# Altium footprint library My Footprint 3D.PCBLIB: 447 footprints (part 15 of 29)
Each footprint in its own frame and in the unit in brackets; x right, y up, seen from the top. Pads: shape width x height; smd on the part's side, far side on the other; paste and mask are expansions set on the pad; w line width, h text height; cw(c..) or ccw(c..) is an arc to the next point about the centre after c.
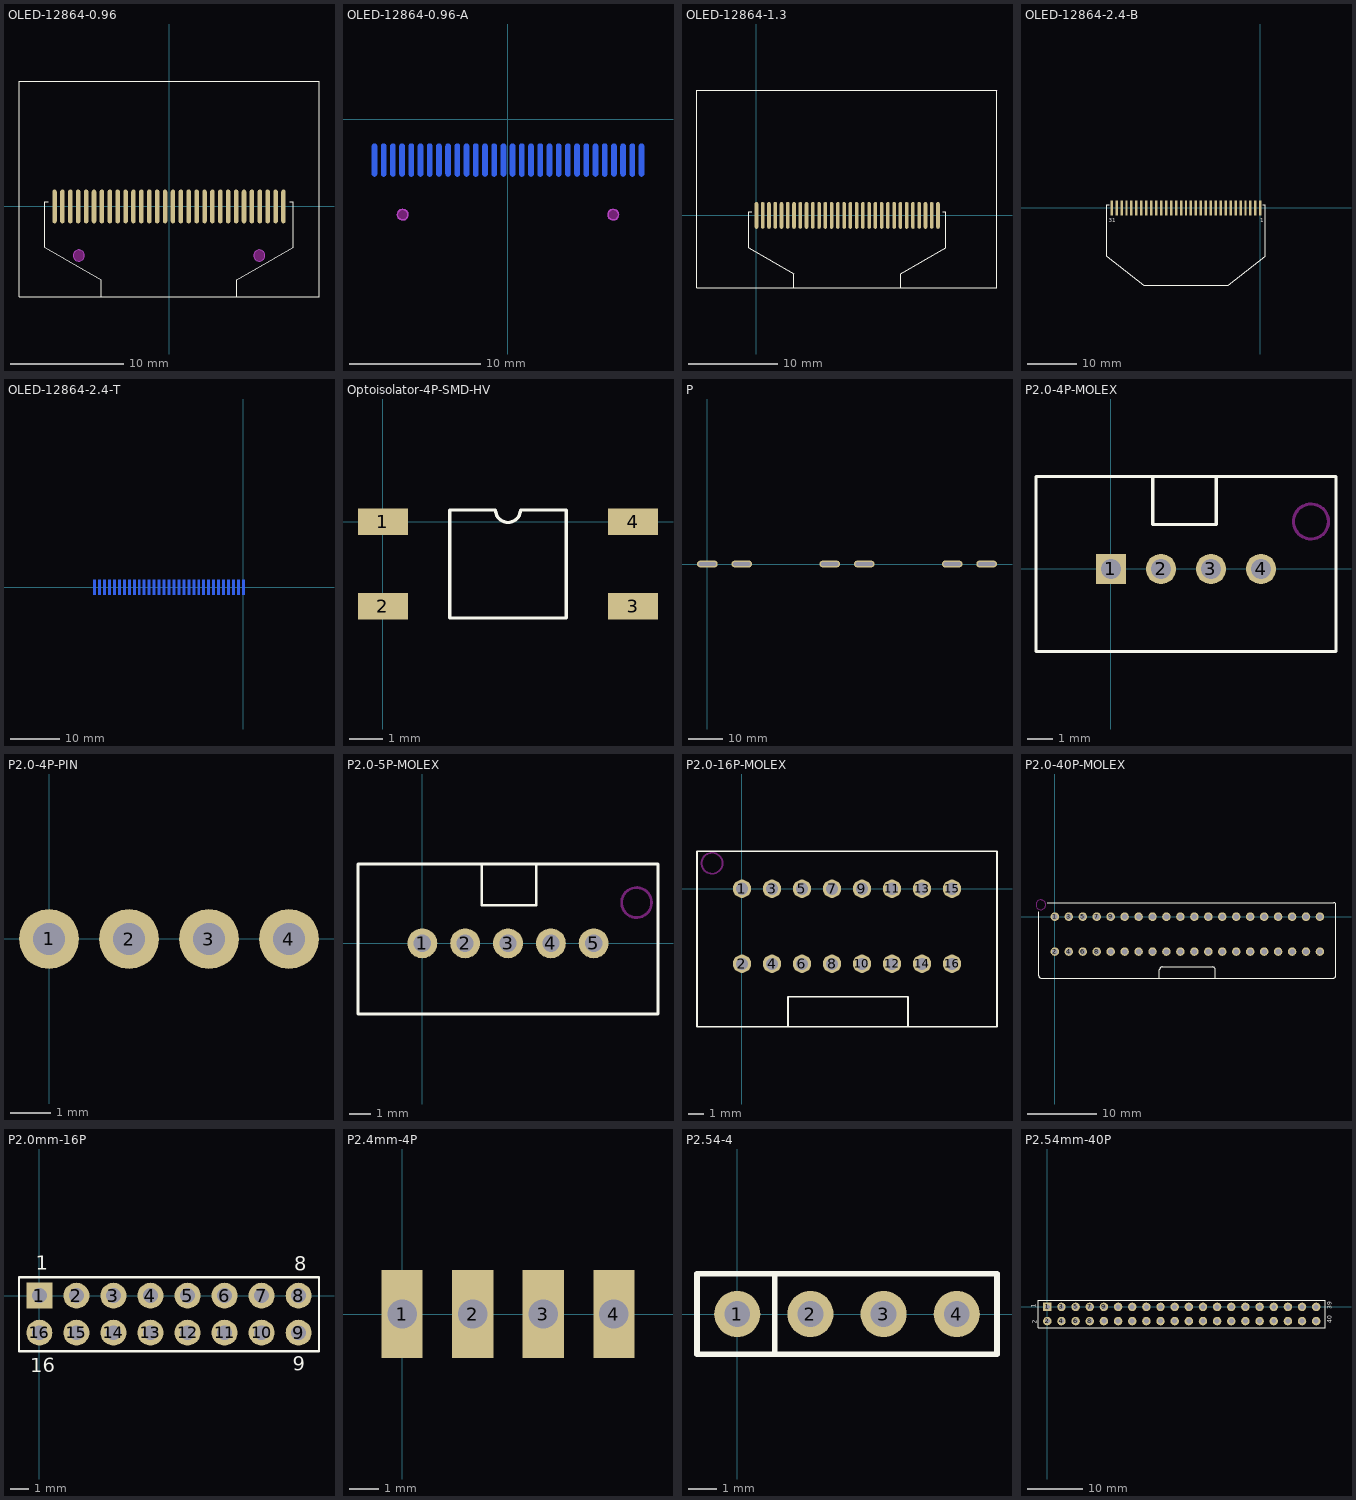
[diagram p14: the footprints below, top view; thin cyan lines are the x and y axes]

## OLED-12864-0.96 [mm]
pads (30):
  oval 0.4x3 smd: 1(-10.15,0) 2(-9.45,0) 3(-8.75,0) 4(-8.05,0) 5(-7.35,0) 6(-6.65,0) 7(-5.95,0) 8(-5.25,0) 9(-4.55,0) 10(-3.85,0) 11(-3.15,0) 12(-2.45,0) 13(-1.75,0) 14(-1.05,0) 15(-0.35,0) 16(0.35,0) 17(1.05,0) 18(1.75,0) 19(2.45,0) 20(3.15,0) 21(3.85,0) 22(4.55,0) 23(5.25,0) 24(5.95,0) 25(6.65,0) 26(7.35,0) 27(8.05,0) 28(8.75,0) 29(9.45,0) 30(10.15,0)
Top Overlay:
  lines w0.1: -10.7,0.4 -11,0.4 -11,-3.6 -6,-6.5 ; -6,-8 -6,-6.5 ; 10.7,0.4 11,0.4 11,-3.6 6,-6.5 6,-8 ; -6,-6.5 ccw(c-6,-6.5) -6,-6.5 ; 6,-8 ccw(c6,-8) 6,-8 ; -13.3,-8 13.3,-8 13.3,11.1 -13.3,11.1 -13.3,-8
Keep-Out Layer:
  board cut-out: -8,-3.85 -7.901,-3.85 -7.717,-3.926 -7.576,-4.067 -7.5,-4.251 -7.5,-4.35 -7.5,-4.449 -7.576,-4.633 -7.717,-4.774 -7.901,-4.85 -8,-4.85 -8.099,-4.85 -8.283,-4.774 -8.424,-4.633 -8.5,-4.449 -8.5,-4.35 -8.5,-4.251 -8.424,-4.067 -8.283,-3.926 -8.099,-3.85
  board cut-out: 8,-3.85 8.099,-3.85 8.283,-3.926 8.424,-4.067 8.5,-4.251 8.5,-4.35 8.5,-4.449 8.424,-4.633 8.283,-4.774 8.099,-4.85 8,-4.85 7.901,-4.85 7.717,-4.774 7.576,-4.633 7.5,-4.449 7.5,-4.35 7.5,-4.251 7.576,-4.067 7.717,-3.926 7.901,-3.85
Mechanical 2:
  circle w0.1: c-8,-4.35 r0.5
  circle w0.1: c8,-4.35 r0.5
3D body: height 0.1, standoff 0, extent -11,-8 11,0.4
3D body: height 3.5, standoff 3.4, extent -6,-8.9 6,-7.2
3D body: height 3.5, standoff 3, extent -6,-8.9 6,-8.8
3D body: height 3.49, standoff 3, extent -5,-7.1 5,-5.6
3D body: height 4.3, standoff 4.2, extent -13.3,-3.5 13.3,10.9
3D body: height 4.31, standoff 4.3, extent -10.875,-1.75 10.875,9.15
3D body: height 4.29, standoff 3.51, extent -13.4,-8.05 13.4,11.15
3D body: height 3.5, standoff 2.9, extent -13.4,-3.75 13.4,11.15

## OLED-12864-0.96-A [mm]
pads (30):
  oval 0.4x2.5 smd far side: 1(-10.15,-3.1) 2(-9.45,-3.1) 3(-8.75,-3.1) 4(-8.05,-3.1) 5(-7.35,-3.1) 6(-6.65,-3.1) 7(-5.95,-3.1) 8(-5.25,-3.1) 9(-4.55,-3.1) 10(-3.85,-3.1) 11(-3.15,-3.1) 12(-2.45,-3.1) 13(-1.75,-3.1) 14(-1.05,-3.1) 15(-0.35,-3.1) 16(0.35,-3.1) 17(1.05,-3.1) 18(1.75,-3.1) 19(2.45,-3.1) 20(3.15,-3.1) 21(3.85,-3.1) 22(4.55,-3.1) 23(5.25,-3.1) 24(5.95,-3.1) 25(6.65,-3.1) 26(7.35,-3.1) 27(8.05,-3.1) 28(8.75,-3.1) 29(9.45,-3.1) 30(10.15,-3.1)
Bottom Overlay:
  lines w0.1: -10.7,-2.5 -11,-2.5 -11,-6.5 -7.158,-8.728 ; 7.127,-8.746 11,-6.5 11,-2.5 10.7,-2.5
Keep-Out Layer:
  circle w0.1: c8,-7.25 r0.4
  circle w0.1: c-8,-7.25 r0.4
  board cut-out: 8,-6.85 8.08,-6.85 8.227,-6.911 8.339,-7.023 8.4,-7.17 8.4,-7.25 8.4,-7.33 8.339,-7.477 8.227,-7.589 8.08,-7.65 8,-7.65 7.92,-7.65 7.773,-7.589 7.661,-7.477 7.6,-7.33 7.6,-7.25 7.6,-7.17 7.661,-7.023 7.773,-6.911 7.92,-6.85
  board cut-out: -8,-6.85 -7.92,-6.85 -7.773,-6.911 -7.661,-7.023 -7.6,-7.17 -7.6,-7.25 -7.6,-7.33 -7.661,-7.477 -7.773,-7.589 -7.92,-7.65 -8,-7.65 -8.08,-7.65 -8.227,-7.589 -8.339,-7.477 -8.4,-7.33 -8.4,-7.25 -8.4,-7.17 -8.339,-7.023 -8.227,-6.911 -8.08,-6.85
Mechanical 2:
  circle w0.1: c8,-7.25 r0.4
  circle w0.1: c-8,-7.25 r0.4
3D body: height 2.5, standoff 1.9, extent -13.4,-3.75 13.4,11.15
3D body: height 3.29, standoff 2.51, extent -13.4,-8.05 13.4,11.15
3D body: height 3.31, standoff 3.3, extent -10.875,-1.75 10.875,9.15
3D body: height 3.3, standoff 3.2, extent -13.3,-3.5 13.3,10.9
3D body: height 2.49, standoff 2, extent -5,-7.1 5,-5.6
3D body: height 2.5, standoff -1.2, extent -6,-8.9 6,-8.8
3D body: height 2.5, standoff 2.4, extent -6,-8.9 6,-7.2
3D body: height -1, standoff -1.2, extent -11,-8.927 11,-2.5

## OLED-12864-1.3 [mm]
pads (30):
  oval 0.4x3 smd: 1(0,0) 2(0.7,0) 3(1.4,0) 4(2.1,0) 5(2.8,0) 6(3.5,0) 7(4.2,0) 8(4.9,0) 9(5.6,0) 10(6.3,0) 11(7,0) 12(7.7,0) 13(8.4,0) 14(9.1,0) 15(9.8,0) 16(10.5,0) 17(11.2,0) 18(11.9,0) 19(12.6,0) 20(13.3,0) 21(14,0) 22(14.7,0) 23(15.4,0) 24(16.1,0) 25(16.8,0) 26(17.5,0) 27(18.2,0) 28(18.9,0) 29(19.6,0) 30(20.3,0)
Top Overlay:
  lines w0.1: -0.55,0.4 -0.85,0.4 -0.85,-3.6 4.15,-6.5 4.15,-8.1 ; 16.15,-8.1 16.15,-6.5 21.15,-3.6 21.15,0.4 20.85,0.4 ; -6.65,-8.1 26.85,-8.1 26.85,14 -6.65,14 -6.65,-8.1
Mechanical 1:
  lines w0.1: -6.6,14 26.9,14
3D body: height 0.85, standoff 0.15, extent -7.1,-4.7 27.4,14.5
3D body: height 1.6, standoff 0.85, extent -7.1,-8.5 27.4,14.5
3D body: height 1.75, standoff 1.6, extent -6.6,-4.2 26.9,14
3D body: height 0.8, standoff 0.7, extent -4.55,-2.45 24.85,12.25
3D body: height 0.1, standoff 0, extent -0.85,-9.6 21.15,0.4
3D body: height 0.85, standoff 0.75, extent 4.15,-9.6 16.15,-6.5
3D body: height 0.85, standoff 0, extent 4.15,-9.6 16.15,-9.5
3D body: height 0.85, standoff 0.5, extent 5.15,-7.1 15.15,-5.6

## OLED-12864-2.4-B [mm]
pads (31):
  rect 0.5x3 smd: 1(0,0) 2(-1,0) 3(-2,0) 4(-3,0) 5(-4,0) 6(-5,0) 7(-6,0) 8(-7,0) 9(-8,0) 10(-9,0) 11(-10,0) 12(-11,0) 13(-12,0) 14(-13,0) 15(-14,0) 16(-15,0) 17(-16,0) 18(-17,0) 19(-18,0) 20(-19,0) 21(-20,0) 22(-21,0) 23(-22,0) 24(-23,0) 25(-24,0) 26(-25,0) 27(-26,0) 28(-27,0) 29(-28,0) 30(-29,0) 31(-30,0)
Top Overlay:
  lines w0.1: -30.494,0.635 -31,0.635 -31,-9.8 -23.559,-15.6 -6.441,-15.6 1,-9.8 1,0.635 0.494,0.635
  text "31" at -30.621,-2.921 h0.8
  text "1" at -0.014,-2.921 h0.8
Bottom Overlay:
  lines w0.2: -45.25,-13.801 15.25,-13.801 15.25,23.199 -45.25,23.199 -45.25,-13.801 ; -43.505,-7.371 13.505,-7.371 13.505,22.119 -43.505,22.119 -43.505,-7.371
3D body: height 1.45, standoff 1.35, extent -23.6,-15.6 -6.4,-10.6
3D body: height 0.1, standoff -2, extent -23.6,-15.6 -6.4,-15.5
3D body: height 2.5, standoff 2.4, extent -45.25,-8.8 15.25,23.2
3D body: height 2.4, standoff 1.4, extent -45.25,-13.8 15.25,-8.8
3D body: height 2.4, standoff 0, extent -45.25,-8.8 15.25,23.2
3D body: height 0.1, standoff 0, extent -31,-15.6 1,0.6
3D body: height 0.11, standoff 0.1, extent -0.2,-1.5 0.2,0.6
3D body: height 0.11, standoff 0.1, extent -1.2,-1.5 -0.8,0.6
3D body: height 0.11, standoff 0.1, extent -2.2,-1.5 -1.8,0.6
3D body: height 0.11, standoff 0.1, extent -3.2,-1.5 -2.8,0.6
3D body: height 0.11, standoff 0.1, extent -4.2,-1.5 -3.8,0.6
3D body: height 0.11, standoff 0.1, extent -5.2,-1.5 -4.8,0.6
3D body: height 0.11, standoff 0.1, extent -6.2,-1.5 -5.8,0.6
3D body: height 0.11, standoff 0.1, extent -7.2,-1.5 -6.8,0.6
3D body: height 0.11, standoff 0.1, extent -15.2,-1.5 -14.8,0.6
3D body: height 0.11, standoff 0.1, extent -14.2,-1.5 -13.8,0.6
3D body: height 0.11, standoff 0.1, extent -13.2,-1.5 -12.8,0.6
3D body: height 0.11, standoff 0.1, extent -12.2,-1.5 -11.8,0.6
3D body: height 0.11, standoff 0.1, extent -11.2,-1.5 -10.8,0.6
3D body: height 0.11, standoff 0.1, extent -10.2,-1.5 -9.8,0.6
3D body: height 0.11, standoff 0.1, extent -9.2,-1.5 -8.8,0.6
3D body: height 0.11, standoff 0.1, extent -8.2,-1.5 -7.8,0.6
3D body: height 0.11, standoff 0.1, extent -23.2,-1.5 -22.8,0.6
3D body: height 0.11, standoff 0.1, extent -22.2,-1.5 -21.8,0.6
3D body: height 0.11, standoff 0.1, extent -21.2,-1.5 -20.8,0.6
3D body: height 0.11, standoff 0.1, extent -20.2,-1.5 -19.8,0.6
3D body: height 0.11, standoff 0.1, extent -19.2,-1.5 -18.8,0.6
3D body: height 0.11, standoff 0.1, extent -18.2,-1.5 -17.8,0.6
3D body: height 0.11, standoff 0.1, extent -17.2,-1.5 -16.8,0.6
3D body: height 0.11, standoff 0.1, extent -16.2,-1.5 -15.8,0.6
3D body: height 0.11, standoff 0.1, extent -30.2,-1.5 -29.8,0.6
3D body: height 0.11, standoff 0.1, extent -29.2,-1.5 -28.8,0.6
3D body: height 0.11, standoff 0.1, extent -28.2,-1.5 -27.8,0.6
3D body: height 0.11, standoff 0.1, extent -27.2,-1.5 -26.8,0.6
3D body: height 0.11, standoff 0.1, extent -26.2,-1.5 -25.8,0.6
3D body: height 0.11, standoff 0.1, extent -25.2,-1.5 -24.8,0.6
3D body: height 0.11, standoff 0.1, extent -24.2,-1.5 -23.8,0.6

## OLED-12864-2.4-T [mm]
pads (31):
  rect 0.5x3 smd far side: 1(0,0) 2(-1,0) 3(-2,0) 4(-3,0) 5(-4,0) 6(-5,0) 7(-6,0) 8(-7,0) 9(-8,0) 10(-9,0) 11(-10,0) 12(-11,0) 13(-12,0) 14(-13,0) 15(-14,0) 16(-15,0) 17(-16,0) 18(-17,0) 19(-18,0) 20(-19,0) 21(-20,0) 22(-21,0) 23(-22,0) 24(-23,0) 25(-24,0) 26(-25,0) 27(-26,0) 28(-27,0) 29(-28,0) 30(-29,0) 31(-30,0)
Bottom Overlay:
  lines w0.2: -45.25,-13.801 -45.25,23.199 15.25,23.199 15.25,-13.801 -45.25,-13.801 ; -43.505,-7.371 -43.505,22.119 13.505,22.119 13.505,-7.371 -43.505,-7.371
  text "31" at -30.621,-2.921 h0.8
  text "1" at -0.014,-2.921 h0.8
3D body: height 0.1, standoff 0, extent -31,-15.6 1,0.6
3D body: height 2.4, standoff 0, extent -45.25,-8.8 15.25,23.2
3D body: height 2.4, standoff 1.4, extent -45.25,-13.8 15.25,-8.8
3D body: height 2.5, standoff 2.4, extent -45.25,-8.8 15.25,23.2
3D body: height 1.45, standoff 1.35, extent -23.6,-16.4 -6.4,-10.6

## Optoisolator-4P-SMD-HV [mm]
pads (4):
  rect 1.5x0.8 smd: 1(0,0) 2(0,-2.54) 3(7.522,-2.54) 4(7.522,0)
Top Overlay:
  lines w0.1: 2.011,-2.895 5.511,-2.895 5.511,0.355 4.136,0.355 cw(c3.761,0.355) 3.761,-0.02 cw(c3.761,0.355) 3.386,0.355 2.011,0.355 2.011,-2.895
3D body: height 1.1, standoff 0.9, extent 6.047,-2.74 6.747,-2.34
3D body: height 1.1, standoff 0, extent 6.747,-2.74 6.947,-2.34
3D body: height 0.2, standoff 0, extent 6.947,-2.74 7.747,-2.34
3D body: height 1.1, standoff 0.9, extent 6.047,-0.2 6.747,0.2
3D body: height 1.1, standoff 0, extent 6.747,-0.2 6.947,0.2
3D body: height 0.2, standoff 0, extent 6.947,-0.2 7.747,0.2
3D body: height 1.1, standoff 0.9, extent 0.775,-0.2 1.475,0.2
3D body: height 1.1, standoff 0, extent 0.575,-0.2 0.775,0.2
3D body: height 0.2, standoff 0, extent -0.225,-0.2 0.575,0.2
3D body: height 1.1, standoff 0.9, extent 0.775,-2.74 1.475,-2.34
3D body: height 1.1, standoff 0, extent 0.575,-2.74 0.775,-2.34
3D body: height 0.2, standoff 0, extent -0.225,-2.74 0.575,-2.34
3D body: height 2, standoff 0.1, extent 1.461,-3.082 6.061,0.543
3D body: height 2.11, standoff 0.1, extent 1.939,-0.726 2.736,0.072

## P [mm]
pads (6):
  oval 6x2 hole 1 slot 5 at 0 deg: 1(0,0) 2(10,0) 3(35.5,0) 4(45.5,0) 5(71,0) 6(81,0)
3D body: height 19, standoff 1, extent -1.5,-0.4 82.6,0.4
3D body: height 1, standoff -2, extent -1.5,-0.4 1.5,0.4
3D body: height 1, standoff -2, extent 8.5,-0.4 11.5,0.4
3D body: height 1, standoff -2, extent 34,-0.4 37,0.4
3D body: height 1, standoff -2, extent 44,-0.4 47,0.4
3D body: height 1, standoff -2, extent 69.5,-0.4 72.5,0.4
3D body: height 1, standoff -2, extent 79.5,-0.4 82.5,0.4

## P2.0-4P-MOLEX [mil]
height 47.24
pads (4):
  rect 48x48 hole 31.5: 1(0,0)
  round 48 hole 31.5: 2(78.74,0) 3(157.48,0) 4(236.22,0)
Top Overlay:
  lines w5: 65.63,145.67 65.63,70 165.63,70 165.63,145.67 ; -118.11,-129.92 -118.11,145.67 354.33,145.67 354.33,-129.92 -118.11,-129.92
Keep-Out Layer:
  circle w5: c314.96,74.8 r27.56

## P2.0-4P-PIN [mm]
pads (4):
  round 1.5 hole 0.8: 1(0,0) 2(2,0) 3(4,0) 4(6,0)
3D body: height 2, standoff 0, extent -1,-1 1,1
3D body: height 4, standoff -2, extent -0.25,-0.25 0.25,0.25
3D body: height 2, standoff 0, extent 1,-1 3,1
3D body: height 2, standoff 0, extent 3,-1 5,1
3D body: height 2, standoff 0, extent 5,-1 7,1
3D body: height 4, standoff -2, extent 1.75,-0.25 2.25,0.25
3D body: height 4, standoff -2, extent 3.75,-0.25 4.25,0.25
3D body: height 4, standoff -2, extent 5.75,-0.25 6.25,0.25

## P2.0-5P-MOLEX [mm]
height 1.2
pads (5):
  round 1.4 hole 0.8: 1(0,0) 2(2,0) 3(4,0) 4(6,0) 5(8,0)
Top Overlay:
  lines w0.127: 2.778,3.7 2.778,1.778 5.318,1.778 5.318,3.7 ; -3,-3.3 11,-3.3 11,3.7 -3,3.7 -3,-3.3
Keep-Out Layer:
  circle w0.127: c10,1.9 r0.7
3D body "559320530.stp": height 9.75, standoff -3.16, extent -3,-3 11,3.7

## P2.0-16P-MOLEX [mm]
pads (16):
  round 1.219 hole 0.8: 1(0,0) 2(0,-5) 3(2,0) 4(2,-5) 5(4,0) 6(4,-5) 7(6,0) 8(6,-5) 9(8,0) 10(8,-5) 11(10,0) 12(10,-5) 13(12,0) 14(12,-5) 15(14,0) 16(14,-5)
Top Overlay:
  lines w0.127: 3.062,-9.2 3.062,-7.199 11.062,-7.199 11.062,-9.137 ; -3,-9.2 17,-9.2 17,2.5 -3,2.5 -3,-9.2
Keep-Out Layer:
  circle w0.127: c-2,1.7 r0.7
3D body: height 0.2, standoff 0, extent -2.997,-9.22 16.993,2.489
3D body: height 9, standoff 0, extent -2.997,2.108 16.993,2.489
3D body: height 9, standoff 0, extent -3.023,-9.22 17.018,-8.077
3D body: height 9, standoff 0, extent -2.997,-8.852 -2.438,2.108
3D body: height 9, standoff 0, extent 16.434,-8.826 16.993,2.134
3D body: height 4, standoff 0, extent -0.175,-5.258 0.124,-4.958
3D body: height 4, standoff 0, extent 1.825,-5.258 2.124,-4.958
3D body: height 4, standoff 0, extent 3.825,-5.258 4.124,-4.958
3D body: height 4, standoff 0, extent 3.825,-5.258 4.124,-4.958
3D body: height 4, standoff 0, extent 5.825,-5.258 6.124,-4.958
3D body: height 4, standoff 0, extent 7.825,-5.258 8.124,-4.958
3D body: height 4, standoff 0, extent 9.825,-5.258 10.124,-4.958
3D body: height 4, standoff 0, extent 11.825,-5.258 12.124,-4.958
3D body: height 4, standoff 0, extent 13.825,-5.258 14.124,-4.958
3D body: height 4, standoff 0, extent 13.825,-0.258 14.124,0.042
3D body: height 4, standoff 0, extent 11.825,-0.258 12.124,0.042
3D body: height 4, standoff 0, extent 9.825,-0.258 10.124,0.042
3D body: height 4, standoff 0, extent 7.825,-0.258 8.124,0.042
3D body: height 4, standoff 0, extent 5.825,-0.258 6.124,0.042
3D body: height 4, standoff 0, extent 3.825,-0.258 4.124,0.042
3D body: height 4, standoff 0, extent 1.825,-0.258 2.124,0.042
3D body: height 4, standoff 0, extent -0.175,-0.258 0.124,0.042

## P2.0-40P-MOLEX [mm]
pads (40):
  round 1.219 hole 0.8: 1(0,0) 2(0,-5) 3(2,0) 4(2,-5) 5(4,0) 6(4,-5) 7(6,0) 8(6,-5) 9(8,0) 10(8,-5) 11(10,0) 12(10,-5) 13(12,0) 14(12,-5) 15(14,0) 16(14,-5) 17(16,0) 18(16,-5) 19(18,0) 20(18,-5) 21(20,0) 22(20,-5) 23(22,0) 24(22,-5) 25(24,0) 26(24,-5) 27(26,0) 28(26,-5) 29(28,0) 30(28,-5) 31(30,0) 32(30,-5) 33(32,0) 34(32,-5) 35(34,0) 36(34,-5) 37(36,0) 38(36,-5) 39(38,0) 40(38,-5)
Top Overlay:
  lines w0.1: -2.3,0.7 -2.3,-8.5 ccw(c-2,-8.5) -2,-8.8 39.9,-8.8 ccw(c39.9,-8.4) 40.3,-8.4 40.3,1.7 ccw(c40,1.7) 40,2 -1.1,2 ; 15,-8.8 15,-7.6 cw(c15.4,-7.6) 15.4,-7.2 22.6,-7.2 cw(c22.6,-7.6) 23,-7.6 23,-8.8
Keep-Out Layer:
  circle w0.127: c-2,1.7 r0.7
3D body "559174010.stp": height 9.75, standoff -3.2, extent -2.7,-9.149 40.7,2.351

## P2.0mm-16P [mm]
pads (16):
  rect 1.4x1.4 hole 0.8: 1(0,0)
  round 1.4 hole 0.8: 2(2,0) 3(4,0) 4(6,0) 5(8,0) 6(10,0) 7(12,0) 8(14,0) 9(14,-2) 10(12,-2) 11(10,-2) 12(8,-2) 13(6,-2) 14(4,-2) 15(2,-2) 16(0,-2)
Top Overlay:
  lines w0.127: -1.1,-3 -1.1,1 15.1,1 15.1,-3 -1.1,-3
  text "1" at -0.203,1.397 h0.76
  text "16" at -0.483,-4.14 h0.76
  text "9" at 13.691,-4.064 h0.76
  text "8" at 13.767,1.346 h0.76

## P2.4mm-4P [mm]
pads (4):
  rect 1.4x3 hole 1: 1(0,0) 2(2.4,0) 3(4.8,0) 4(7.2,0)

## P2.54-4 [mm]
pads (4):
  round 1.6 hole 0.9: 1(0,0) 2(2.54,0) 3(5.08,0) 4(7.62,0)
Top Overlay:
  lines w0.2: 1.3,-1.397 1.3,1.397 ; -1.397,-1.397 -1.397,1.397 9.017,1.397 9.017,-1.397 -1.397,-1.397

## P2.54mm-40P [mil]
pads (40):
  rect 60x60 hole 35: 1(0,0)
  round 60 hole 35: 2(0,-100) 3(100,0) 4(100,-100) 5(200,0) 6(200,-100) 7(300,0) 8(300,-100) 9(400,0) 10(400,-100) 11(500,0) 12(500,-100) 13(600,0) 14(600,-100) 15(700,0) 16(700,-100) 17(800,0) 18(800,-100) 19(900,0) 20(900,-100) 21(1000,0) 22(1000,-100) 23(1100,0) 24(1100,-100) 25(1200,0) 26(1200,-100) 27(1300,0) 28(1300,-100) 29(1400,0) 30(1400,-100) 31(1500,0) 32(1500,-100) 33(1600,0) 34(1600,-100) 35(1700,0) 36(1700,-100) 37(1800,0) 38(1800,-100) 39(1900,0) 40(1900,-100)
Top Overlay:
  lines w5: -63.78,-148.43 1963.78,-148.43 1963.78,48.43 -63.78,48.43 -63.78,-148.43
  text "1" at -80,-5 h30
  text "2" at -75,-120 h30
  text "40" at 2010,-115 h30
  text "39" at 2010,-15 h30